# Altium footprint library connectors_socets.pcblib: 601 footprints (part 31 of 38)
Each footprint in its own frame and in the unit in brackets; x right, y up, seen from the top. Pads: shape width x height; smd on the part's side, far side on the other; paste and mask are expansions set on the pad; w line width, h text height; cw(c..) or ccw(c..) is an arc to the next point about the centre after c.
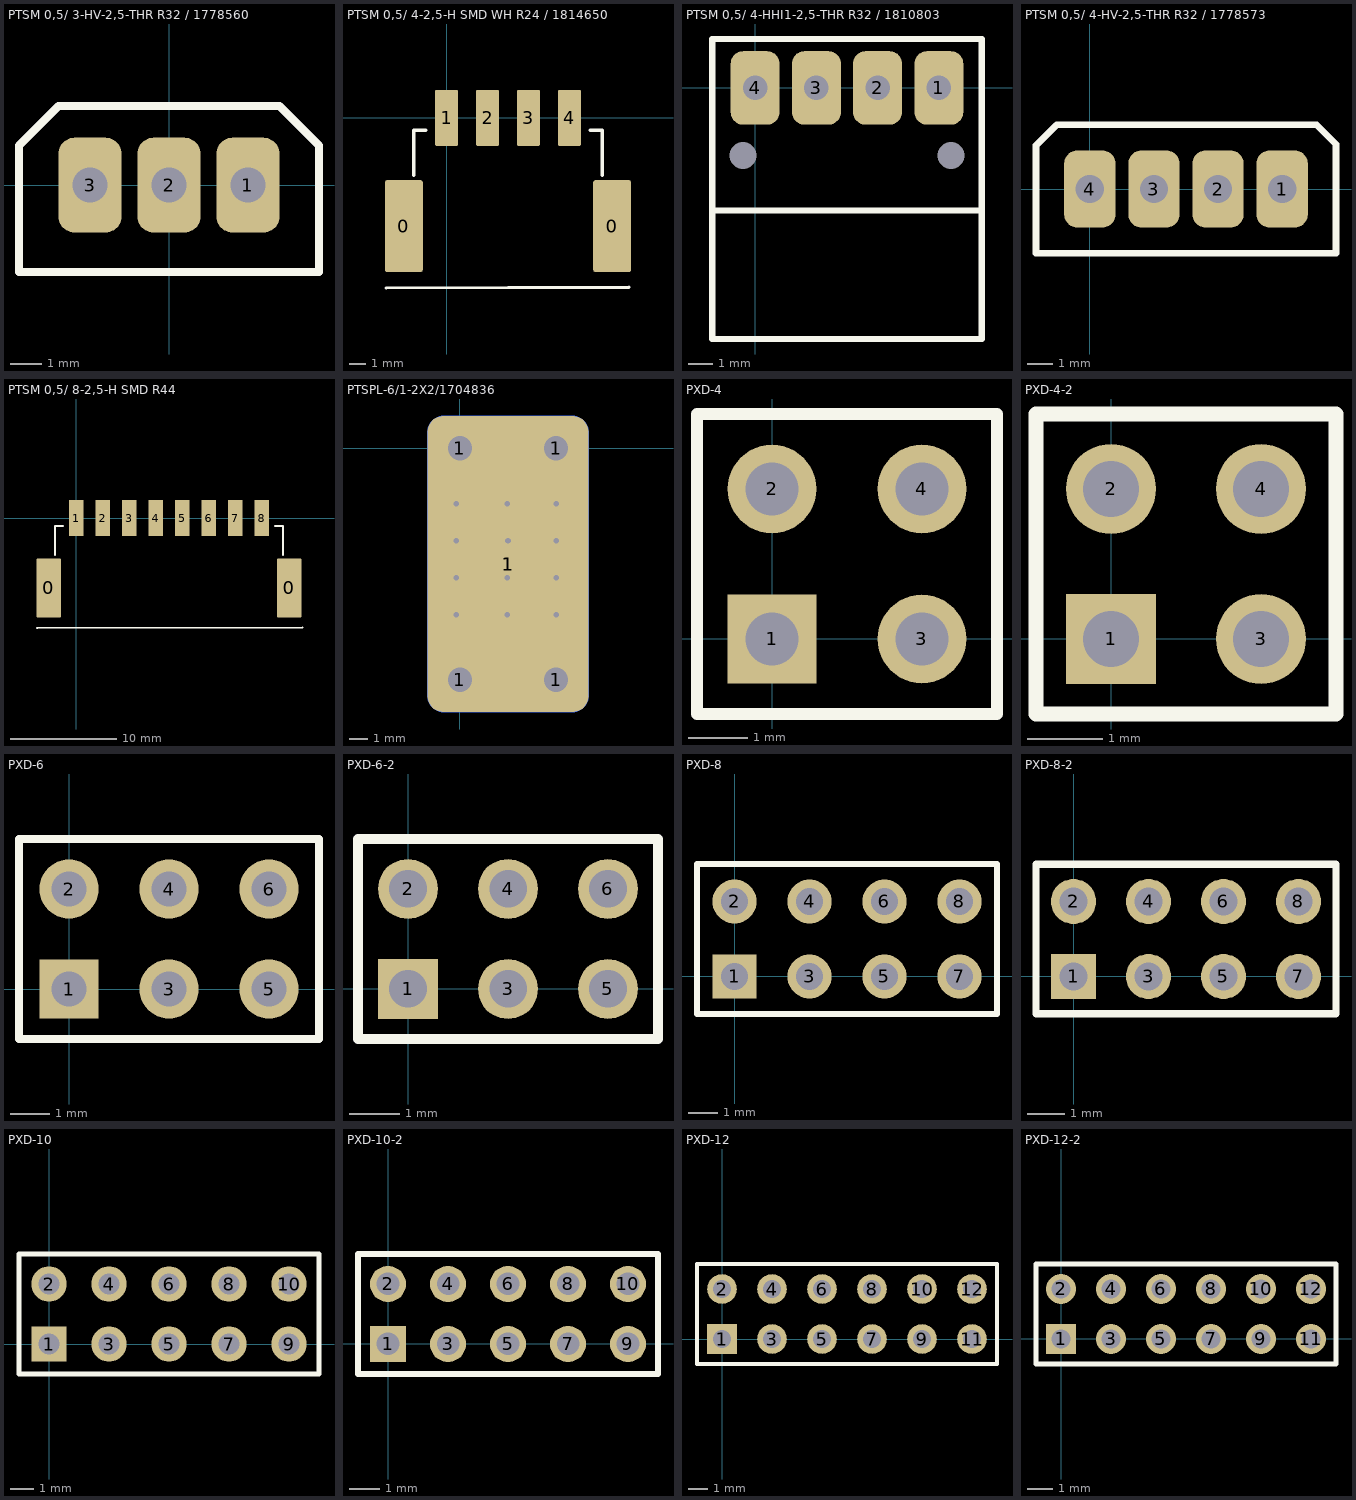
[diagram p30: the footprints below, top view; thin cyan lines are the x and y axes]

## PTSM 0,5/ 3-HV-2,5-THR R32 / 1778560 [mm]
height 5
pads (3):
  rrect50% 2x3 hole 1.1: 1(2.5,0) 2(0,0) 3(-2.5,0)
Top Overlay:
  lines w0.254: -4.75,-2.75 4.75,-2.75 4.75,1.25 3.5,2.5 -3.5,2.5 -4.75,1.25 -4.75,-2.75
3D body "pxc_1778560_02_PTSM-0-5-3-HV-2-5-THR-R32_3D.stp": height 7.6, standoff -2, extent -4.6,-2.5 4.6,2.5

## PTSM 0,5/ 4-2,5-H SMD WH R24 / 1814650 [mm]
pads (6):
  rrect10% 2.3x5.6 smd: 0(-2.6,-6.6) 0(10.1,-6.6)
  rrect10% 1.4x3.4 smd: 1(0,0) 2(2.5,0) 3(5,0) 4(7.5,0)
Top Overlay:
  lines w0.2: -3.675,-10.375 11.125,-10.325 ; -2,-3.5 -2,-0.75 -1.25,-0.75 ; 8.75,-0.75 9.5,-0.75 9.5,-3.5
3D body "pxc_1814650_00_00_PTSM-0-5-4-2-5-H-SMD-WH-R24_3D.stp": height 5.1, standoff -0.02, extent -3.475,-10.325 10.925,0.675

## PTSM 0,5/ 4-HHI1-2,5-THR R32 / 1810803 [mm]
height 5
pads (6):
  rrect50% 2x3 hole 1: 1(7.5,0) 2(5,0) 3(2.5,0) 4(0,0)
  round 0 hole 1.1 unplated mask+0.05: MNT1(-0.5,-2.75) MNT2(8,-2.75)
Top Overlay:
  lines w0.254: -1.75,-5 9.25,-5 ; -1.75,-10.25 -1.75,2 9.25,2 9.25,-10.25 -1.75,-10.25
3D body "pxc_1810803_01_PTSM-0-5-4-HHI1-2-5-THR-R32_3D.stp": height 5.07, standoff -2.03, extent -1.7,-10.1 9.2,1.9

## PTSM 0,5/ 4-HV-2,5-THR R32 / 1778573 [mm]
height 5
pads (4):
  rrect50% 2x3 hole 1.1: 1(7.5,0) 2(5,0) 3(2.5,0) 4(0,0)
Top Overlay:
  lines w0.254: -2.05,1.75 -1.3,2.5 ; -1.3,2.5 -2.1,1.7 -2.1,-2.5 9.6,-2.5 9.6,1.75 8.85,2.5 -1.3,2.5
3D body "pxc_1778573_02_PTSM-0-5-4-HV-2-5-THR-R32_3D - ptsm_0.5-4-hv-2.5-thr.step": height 7.6, standoff -2, extent -2.1,-2.5 9.6,2.5

## PTSM 0,5/ 8-2,5-H SMD R44 [mm]
pads (10):
  rrect10% 2.3x5.6 smd: 0(-2.6,-6.6) 0(20.1,-6.6)
  rrect10% 1.4x3.4 smd: 1(0,0) 2(2.5,0) 3(5,0) 4(7.5,0) 5(10,0) 6(12.5,0) 7(15,0) 8(17.5,0)
Top Overlay:
  lines w0.2: -3.675,-10.375 21.35,-10.325 ; -2,-3.5 -2,-0.75 -1.25,-0.75 ; 18.75,-0.75 19.5,-0.75 19.5,-3.5
3D body "pxc_1771088_00_00_PTSM-0-5-8-2-5-H-SMD-R44_3D.stp": height 5.1, standoff -0.02, extent -3.425,-10.25 20.975,0.75

## PTSPL-6/1-2X2/1704836 [mm] "1 pin"
pads (6):
  rrect50% 3.5x3.5 hole 1.3 unplated: 1(0,-12.5) 1(0,0) 1(5.2,-12.5) 1(5.2,0)
  rrect20% 8.7x16 smd: 1(2.6,-6.25)
  rrect20% 8.7x16 smd far side mask+0.102: 1(2.6,-6.25)
via 5.2,-9 diameter 0.7 hole 0.3
via 5.2,-7 diameter 0.7 hole 0.3
via 5.2,-5 diameter 0.7 hole 0.3
via 5.2,-3 diameter 0.7 hole 0.3
via 2.6,-5 diameter 0.7 hole 0.3
via 2.562,-3 diameter 0.7 hole 0.3
via 2.562,-7 diameter 0.7 hole 0.3
via 2.562,-9 diameter 0.7 hole 0.3
via -0.2,-9 diameter 0.7 hole 0.3
via -0.2,-7 diameter 0.7 hole 0.3
via -0.2,-5 diameter 0.7 hole 0.3
via -0.2,-3 diameter 0.7 hole 0.3
Top Solder:
  region: 5.575,-10.65 0.05,-10.65 0.05,-10.875 1.025,-11.85 1.025,-13.225 0.75,-13.225 0.25,-13.725 0.25,-14.35 5.125,-14.35 5.125,-13.475 4.35,-12.7 4.525,-12.525 4.525,-11.825 5.075,-11.825 5.575,-11.325
  region: -0.2,-1.85 5.325,-1.85 5.325,-1.625 4.35,-0.65 4.35,0.725 4.625,0.725 5.125,1.225 5.125,1.85 0.25,1.85 0.25,0.975 1.025,0.2 0.85,0.025 0.85,-0.675 0.3,-0.675 -0.2,-1.175
Bottom Solder:
  region: -0.2,-1.85 5.325,-1.85 5.325,-1.625 4.35,-0.65 4.35,0.725 4.625,0.725 5.125,1.225 5.125,1.85 0.25,1.85 0.25,0.975 1.025,0.2 0.85,0.025 0.85,-0.675 0.3,-0.675 -0.2,-1.175
  region: 5.575,-10.65 0.05,-10.65 0.05,-10.875 1.025,-11.85 1.025,-13.225 0.75,-13.225 0.25,-13.725 0.25,-14.35 5.125,-14.35 5.125,-13.475 4.35,-12.7 4.525,-12.525 4.525,-11.825 5.075,-11.825 5.575,-11.325
3D body "pxc_1704836_00_PTSPL-6-1-2X2-2-1-R32_3D.stp": height 10.8, standoff -2.1, extent -1.775,-13.796 6.925,1.146

## PXD-4 [mm] "Connector; Header; 2x2 Position"
height 0.001
pads (4):
  rect 1.5x1.5 hole 0.9: 1(0,0)
  round 1.5 hole 0.9: 2(0,2.54) 3(2.54,0) 4(2.54,2.54)
Top Overlay:
  lines w0.2: -1.27,-1.27 -1.27,3.81 3.81,3.81 3.81,-1.27 -1.27,-1.27

## PXD-4-2 [mm] "Connector; Header; 2x2 Position"
height 0.001
pads (4):
  rect 1.2x1.2 hole 0.75: 1(0,0)
  round 1.2 hole 0.75: 2(0,2) 3(2,0) 4(2,2)
Top Overlay:
  lines w0.2: -1,-1 -1,3 3,3 3,-1 -1,-1

## PXD-6 [mm] "Connector; Header; 3x2 Position"
height 0.001
pads (6):
  rect 1.5x1.5 hole 0.9: 1(0,0)
  round 1.5 hole 0.9: 2(0,2.54) 3(2.54,0) 4(2.54,2.54) 5(5.08,0) 6(5.08,2.54)
Top Overlay:
  lines w0.2: -1.27,-1.27 6.35,-1.27 6.35,3.81 -1.27,3.81 -1.27,-1.27

## PXD-6-2 [mm] "Connector; Header; 3x2 Position"
height 0.001
pads (6):
  rect 1.2x1.2 hole 0.75: 1(0,0)
  round 1.2 hole 0.75: 2(0,2) 3(2,0) 4(2,2) 5(4,0) 6(4,2)
Top Overlay:
  lines w0.2: -1,-1 -1,3 5,3 5,-1 -1,-1

## PXD-8 [mm] "Connector; Header; 4x2 Position"
height 0.001
pads (8):
  rect 1.5x1.5 hole 0.9: 1(0,0)
  round 1.5 hole 0.9: 2(0,2.54) 3(2.54,0) 4(2.54,2.54) 5(5.08,0) 6(5.08,2.54) 7(7.62,0) 8(7.62,2.54)
Top Overlay:
  lines w0.2: -1.27,-1.27 8.89,-1.27 8.89,3.81 -1.27,3.81 -1.27,-1.27

## PXD-8-2 [mm] "Connector; Header; 4x2 Position"
height 0.001
pads (8):
  rect 1.2x1.2 hole 0.75: 1(0,0)
  round 1.2 hole 0.75: 2(0,2) 3(2,0) 4(2,2) 5(4,0) 6(4,2) 7(6,0) 8(6,2)
Top Overlay:
  lines w0.2: -1,-1 -1,3 7,3 7,-1 -1,-1

## PXD-10 [mm] "Connector; Header; 5x2 Position"
height 0.001
pads (10):
  rect 1.5x1.5 hole 0.9: 1(0,0)
  round 1.5 hole 0.9: 2(0,2.54) 3(2.54,0) 4(2.54,2.54) 5(5.08,0) 6(5.08,2.54) 7(7.62,0) 8(7.62,2.54) 9(10.16,0) 10(10.16,2.54)
Top Overlay:
  lines w0.2: -1.27,-1.27 11.43,-1.27 11.43,3.81 -1.27,3.81 -1.27,-1.27

## PXD-10-2 [mm] "Connector; Header; 5x2 Position"
height 0.001
pads (10):
  rect 1.2x1.2 hole 0.75: 1(0,0)
  round 1.2 hole 0.75: 2(0,2) 3(2,0) 4(2,2) 5(4,0) 6(4,2) 7(6,0) 8(6,2) 9(8,0) 10(8,2)
Top Overlay:
  lines w0.2: -1,-1 9,-1 9,3 -1,3 -1,-1

## PXD-12 [mm] "Connector; Header; 6x2 Position"
height 0.001
pads (12):
  rect 1.5x1.5 hole 0.9: 1(0,0)
  round 1.5 hole 0.9: 2(0,2.54) 3(2.54,0) 4(2.54,2.54) 5(5.08,0) 6(5.08,2.54) 7(7.62,0) 8(7.62,2.54) 9(10.16,0) 10(10.16,2.54) 11(12.7,0) 12(12.7,2.54)
Top Overlay:
  lines w0.2: -1.27,-1.27 -1.27,3.81 13.97,3.81 13.97,-1.27 -1.27,-1.27

## PXD-12-2 [mm] "Connector; Header; 6x2 Position"
height 0.001
pads (12):
  rect 1.2x1.2 hole 0.75: 1(0,0)
  round 1.2 hole 0.75: 2(0,2) 3(2,0) 4(2,2) 5(4,0) 6(4,2) 7(6,0) 8(6,2) 9(8,0) 10(8,2) 11(10,0) 12(10,2)
Top Overlay:
  lines w0.2: -1,-1 -1,3 11,3 11,-1 -1,-1